# Altium integrated library RL2.IntLib: 663 symbols (part 4 of 4) (continued)
## PIC32MZ1024EFE100 (continued)

## PLD-6
designator XS?
Part Field 1: *; Part Field 2: *
footprint PLD-6
pins: 1, 2, 3, 4, 5, 6

## PLD-10R
designator XP?, comment PLD-R тип 2(8*13)
Value: *; Part Field 2: 10 конт.
footprint M20-9741042
pins: 1, 2, 3, 4, 5, 6, 7, 8, 9, 10
text: Цепь; Конт.

## PLD-12R
designator XP?, comment PLD-R тип 2(8*13)
Value: *; Part Field 2: 12 конт.
footprint M20-9740642
pins: 1, 2, 3, 4, 5, 6, 7, 8, 9, 10, 11, 12
text: Цепь; Конт.

## PLD-14
designator XP?
Value: *
footprint PLD-14
pins: 1, 2, 3, 4, 5, 6, 7, 8, 9, 10, 11, 12, 13, 14
text: Цепь; Конт.

## PMEG2010AEB
designator VD?  (value not drawn)
PMEG2010AEB; Value: *
footprint SOD523
pins: 1, 2

## PMEG2010AEH
designator VD?  (value not drawn)
PMEG2010AEH; Value: *
footprint SOD123F
pins: 1, 2

## PMEG10010ELR
designator VD?  (value not drawn)
100 V, 1 A low leakage current Schottky barrier rectifier; Value: *
footprint SOD123W
pins: 1, 2

## RCH110
designator L?
Part Field 1: *; Part Field 2: *
footprint RCH-110
pins: 1, 2

## RLB0914
designator L?
Part Field 1: *; Part Field 2: *
footprint RLB0914_H (radial induktor)
footprint RLB0914-V (radial induktor)
pins: 1, 2

## RSMD
designator R?
R0805; Part Field 1: *; Part Field 2: *; Value: *
footprint R0805
footprint R0603
footprint R1206
footprint R0805L
footprint R0603L
pins: 1 Pin1, 2 Pin2
1 alternate drawing of the same symbol

## RV-3129-C3
designator DD?, comment RV-3129-C3 32.768kHz OPTION A TB QA
Part Field 1: *; Part Field 2: *
footprint RV-3129-C3
pins: 1 CLKOE, 2 VDD, 3 CLKOUT, 4 SCL, 5 SDA, 6 VSS, 7 ~{INT}, 8 NC, 9 VBAT, 10 NC

## SCA3100
designator DA?, comment SCA3100-D04
3-AXIS HIGH PERFORMANCE ACCELEROMETER; Part Field 1: *; Part Field 2: *
footprint SCA3100
pins: 1 RES, 2 RES, 3 AVSS, 4 AVDD, 5 CSB, 6 MISO, 7 SCK, 8 MOSI, 9 NC, 10 DVDD, 11 DVSS, 12 EGND

## Si823H4
designator DA?, comment Si823H4AB-IS1
4.0 A Symmetric Drive ISODrivers with Low Propagation Delayand High Transient Immunity
footprint SOIC16
pins: 1 PWM (in), 3 VDDI (in), 4 GNDI (out), 5 EN (power), 6 DT (power), 8 VDDI (power), 9 GNDB (power), 10 VOB (power), 11 VDDB (power), 14 GNDA (power), 15 VOA (power), 16 VDDA (power)

## Si8233BB-C-IS1
designator DD?, comment Si8233BB-D-IS1
footprint SOIC16
pins: 1 VIA (in), 2 VIB (in), 3 VDDI (in), 4 GNDI (out), 5 DIS (power), 6 DT (power), 8 VDDI (power), 9 GNDB (power), 10 VOB (power), 11 VDDB (power), 14 GNDA (power), 15 VOA (power), 16 VDDA (power)

## Si8273
designator DA?, comment Si8273AB-IS1
4 Amp ISOdriver with High Transient (dV/dt) Immunity
footprint SOIC16
pins: 1 VIA (in), 2 VIB (in), 3 VDDI (in), 4 GNDI (out), 5 EN (power), 8 VDDI (power), 9 GNDB (power), 10 VOB (power), 11 VDDB (power), 14 GNDA (power), 15 VOA (power), 16 VDDA (power)

## SIP1X13P
designator XS?
Part Field 1: *; Part Field 2: *
footprint SIP1X13P
pins: 1, 2, 3, 4, 5, 6, 7, 8, 9, 10, 11, 12, 13

## SIP1X14P
designator XS?
Part Field 1: *; Part Field 2: *
footprint SIP1X14P
pins: 1, 2, 3, 4, 5, 6, 7, 8, 9, 10, 11, 12, 13, 14

## SN65LVDS93ADGG
designator DD?
footprint TSSOP56 (JEDEC MO-153)
signal-integrity model Model Name (Model Description)
pins: 1 VCC (power), 2 D5 (in), 3 D6 (in), 4 D7 (in), 5 GND (power), 6 D8 (in), 7 D9 (in), 8 D10 (in), 9 VCC (power), 10 D11 (in), 11 D12 (in), 12 D13 (in), 13 GND (power), 14 D14 (in), 15 D15 (in), 16 D16 (in), 17 CLKSEL (in), 18 D17 (in), 19 D18 (in), 20 D19 (in), 21 GND (power), 22 D20 (in), 23 D21 (in), 24 D22 (in), 25 D23 (in), 26 VCC (power), 27 D24 (in), 28 D25 (in), 29 GND (power), 30 D26 (in), 31 CLKIN (in), 32 ~{SHTDN} (in), 33 PLLGND (power), 34 PLLVCC (power), 35 PLLGND (power), 36 LVDSGND (power), 37 Y3P (hiz), 38 Y3M (hiz), 39 CLKOUTP (hiz), 40 CLKOUTM (hiz), 41 Y2P (hiz), 42 Y2M (hiz), 43 LVDSGND (power), 44 LVDSVCC (power), 45 Y1P (hiz), 46 Y1M (hiz), 47 Y0P (hiz), 48 Y0M (hiz), 49 LVDSGND (power), 50 D27 (in), 51 D0 (in), 52 D1 (in), 53 GND (power), 54 D2 (in), 55 D3 (in), 56 D4 (in)

## SN74LV4052AQPWRQ1
designator DD?
footprint TSSOP16 (JEDEC MO-153)
pins: 1 2Y0 (in), 2 2Y2 (in), 3 2COM (in), 4 2Y3 (out), 5 2Y1 (power), 6 INH (power), 7 GND (power), 8 GND (power), 9 A (power), 10 B (power), 11 1Y3 (power), 12 1Y0 (power), 13 1COM (power), 14 1Y1 (power), 15 1Y2 (power), 16 VCC (power)

## SQ9945BEY
designator VT?
footprint SOIC8 DBL FET
part A pins: 1, 2, 6
part B pins: 3, 4, 5

## SQJ963EP
designator VT?, comment SQJ963EP-T1-GE3
footprint PowerPAK SO-8L Dual
part A pins: 1, 2, 6
part B pins: 3, 4, 5

## SQJ992EP
designator VT?
footprint PowerPAK SO-8L Dual
part A pins: 1, 2, 6
part B pins: 3, 4, 5

## SRN3015
designator L?  (value not drawn)
Value: Value
footprint SRN3015 (Drossel)
pins: 1, 2

## SSW-110-01-G-S
designator XS?
Part Field 1: *; Part Field 2: *
footprint SSW-110-01-G-S
pins: 1, 2, 3, 4, 5, 6, 7, 8, 9, 10

## STGD5NB120SZT4
designator VT?  (value not drawn)
STGD5NB120SZT4; Value: *
footprint D-PAK (TO-252)
pins: 1 G, 2 E, 3 C

## STPS5H100B
designator VD?  (value not drawn)
High voltage power Schottky rectifier 100V 5A 175 °C; Value: *
footprint D-PAK (TO-252)
pins: 2, 3

## STTH1002CB
designator VD?
High efficiency ultrafast diode 2x8 A, 200V, 175 °C, 0.78V, 20ns; Value: *
footprint D-PAK (TO-252)
pins: 1 A1, 2 A2, 3 K

## THL3WI
designator DA?
footprint DC-DC-DIP-16
pins: 1 VI-, 2 EN, 9 VO+, 10 VO-, 16 VI+
text: DC\DC

## TL431AID
designator DA?
footprint SOIC8 JEDEC
pins: 1 C (in), 2 A (in), 3 A (in), 6 A (power), 7 A (power), 8 RF (power)

## TL3116ID
designator DA?
High-speed, Low-power Voltage Comparator
footprint SOIC8 JEDEC
pins: 1 V+ (power), 2 IN+ (in), 3 IN- (in), 4 V- (power), 5 LATCH (in), 6 GND (power), 7 OUT (out), 8 ~{OUT} (power)

## TLE4266G
designator DA?, comment TLE4266GS V10  (value not drawn)
TLE4266G; Value: *
footprint SOT-223
pins: 1 IN, 2 INH, 3 OUT, 4 GND

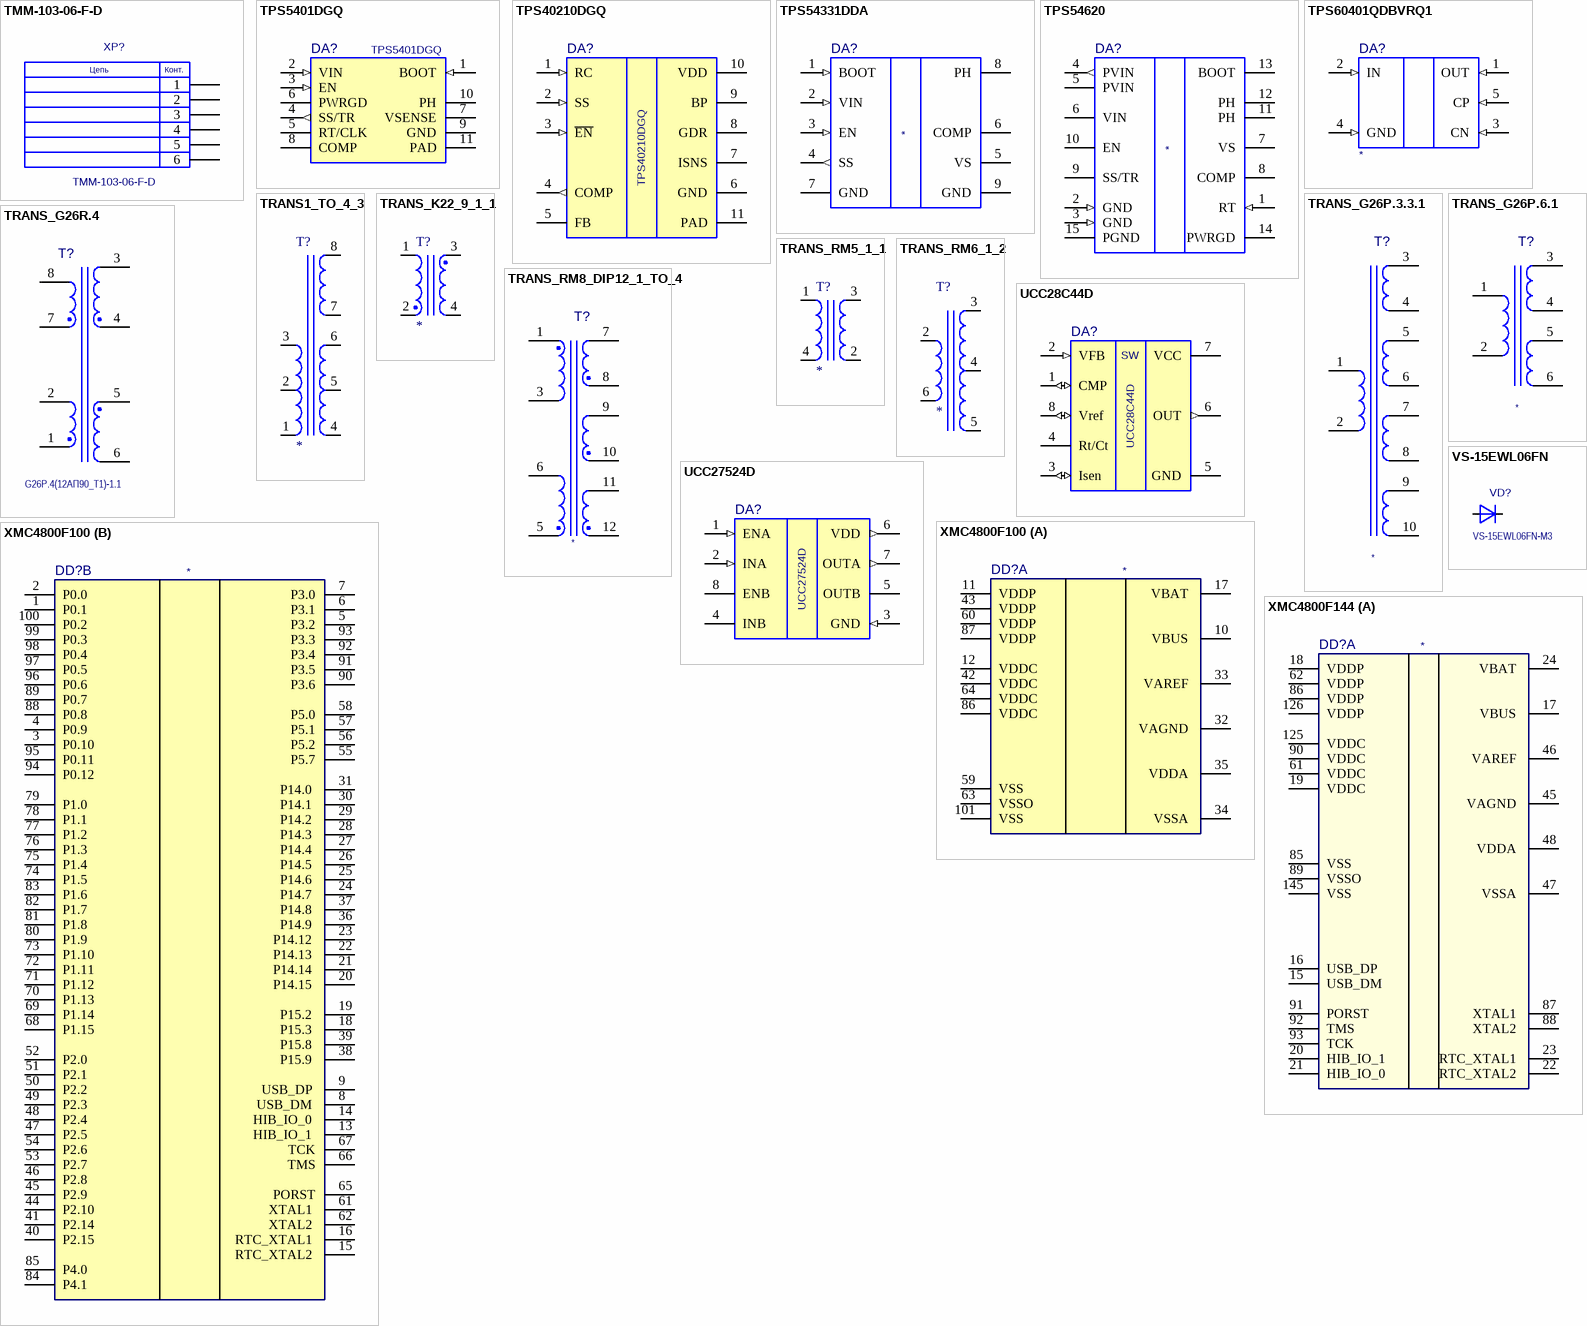
[diagram p32: symbols TMM-103-06-F-D to XMC4800F144]

## TMM-103-06-F-D
designator XP?
Value: *
footprint TMM-103-06-F-D
pins: 1, 2, 3, 4, 5, 6
text: Цепь; Конт.

## TPS5401DGQ
designator DA?
footprint MSOP10 POWERPAD (MO-187-BA)
pins: 1 BOOT (in), 2 VIN (in), 3 EN (in), 4 SS/TR (out), 5 RT/CLK (power), 6 PWRGD (power), 7 VSENSE (power), 8 COMP (power), 9 GND (power), 10 PH (power), 11 PAD (power)

## TPS40210DGQ
designator DA?
footprint MSOP10 POWERPAD (MO-187-BA)
pins: 1 RC (in), 2 SS (in), 3 ~{EN} (in), 4 COMP (out), 5 FB (power), 6 GND (power), 7 ISNS (power), 8 GDR (power), 9 BP (power), 10 VDD (power), 11 PAD (power)

## TPS54331DDA
designator DA?
footprint SOIC8 PowerPAD™
pins: 1 BOOT (in), 2 VIN (in), 3 EN (in), 4 SS (out), 5 VS (power), 6 COMP (power), 7 GND (power), 8 PH (power), 9 GND (power)

## TPS54620
designator DA?
footprint vqfn-14
pins: 1 RT (in), 2 GND (in), 3 GND (in), 4 PVIN (out), 5 PVIN (power), 6 VIN (power), 7 VS (power), 8 COMP (power), 9 SS/TR (power), 10 EN (power), 11 PH (power), 12 PH (power), 13 BOOT (power), 14 PWRGD (power), 15 PGND (power)

## TPS60401QDBVRQ1
designator DA?
footprint SOT23-5
pins: 1 OUT (in), 2 IN (in), 3 CN (in), 4 GND (in), 5 CP (in)

## TRANS1_TO_4_3
designator T?
Part Field 1: *; Part Field 2: *
footprint K24-8-8 (Дроссель)
pins: 1, 2, 3, 4, 5, 6, 7, 8

## TRANS_G26P.3.3.1
designator T?
Part Field 1: *; Part Field 2: *
footprint K22-7-2-8
pins: 1, 2, 3, 4, 5, 6, 7, 8, 9, 10

## TRANS_G26P.6.1
designator T?
Part Field 1: *; Part Field 2: *
footprint K22-7-2-4
pins: 1, 2, 3, 4, 5, 6

## TRANS_G26R.4
designator T?, comment G26P.4(12АП90_Т1)-1.1
Part Field 1: *; Part Field 2: *
footprint EFD20-1-8
footprint KB6-8-DIP
pins: 1, 2, 3, 4, 5, 6, 7, 8

## TRANS_K22_9_1_1
designator T?
Part Field 1: *; Part Field 2: *
footprint K22-9-2-2 (Дроссель)
pins: 1, 2, 3, 4

## TRANS_RM5_1_1
designator T?
Part Field 1: *; Part Field 2: *
footprint RM5-4
pins: 1, 2, 3, 4

## TRANS_RM6_1_2
designator T?
Part Field 1: *; Part Field 2: *
footprint RM6-6_E-045-1 (RM Cores B65807)
pins: 2, 3, 4, 5, 6

## TRANS_RM8_DIP12_1_TO_4
designator T?
Part Field 1: *; Part Field 2: *
footprint KB8-12-DIP FRM0224-K
pins: 1, 3, 5, 6, 7, 8, 9, 10, 11, 12

## UCC28C44D
designator DA?
footprint SOIC8 JEDEC
pins: 1 CMP (io), 2 VFB (in), 3 Isen (io), 4 Rt/Ct, 5 GND (power), 6 OUT (out), 7 VCC (power), 8 Vref (io)
text: SW

## UCC27524D
designator DA?
footprint SOIC8 JEDEC
pins: 1 ENA (in), 2 INA (in), 3 GND (in), 4 INB (power), 5 OUTB (power), 6 VDD (out), 7 OUTA (out), 8 ENB (power)

## VS-15EWL06FN
designator VD?, comment VS-15EWL06FN-M3
Ultralow VF Ultrafast Rectifier, 600V 15A 175 °C; Value: *
footprint D-PAK (TO-252) single diode
pins: 1, 3

## XMC4800F100
designator DD?
footprint LQFP100-25
part A pins: 10 VBUS  (power), 11 VDDP  (power), 12 VDDC  (power), 17 VBAT  (power), 32 VAGND  (power), 33 VAREF  (power), 34 VSSA  (power), 35 VDDA  (power), 42 VDDC  (power), 43 VDDP  (power), 59 VSS (power), 60 VDDP  (power), 63 VSSO  (power), 64 VDDC  (power), 86 VDDC  (power), 87 VDDP  (power), 101 VSS (power)
part B pins: 1 P0.1  (power), 2 P0.0  (power), 3 P0.10  (power), 4 P0.9  (power), 5 P3.2 (power), 6 P3.1 (power), 7 P3.0 (power), 8 USB_DM  (power), 9 USB_DP  (power), 13 HIB_IO_1  (power), 14 HIB_IO_0  (power), 15 RTC_XTAL2  (power), 16 RTC_XTAL1  (power), 18 P15.3  (power), 19 P15.2  (power), 20 P14.15  (power), 21 P14.14  (power), 22 P14.13  (power), 23 P14.12  (power), 24 P14.7  (power), 25 P14.6  (power), 26 P14.5  (power), 27 P14.4  (power), 28 P14.3  (power), 29 P14.2  (power), 30 P14.1  (power), 31 P14.0  (power), 36 P14.9  (power), 37 P14.8  (power), 38 P15.9  (power), 39 P15.8  (power), 40 P2.15  (power), 41 P2.14  (power), 44 P2.10  (power), 45 P2.9 (power), 46 P2.8 (power), 47 P2.5 (power), 48 P2.4 (power), 49 P2.3 (power), 50 P2.2 (power), 51 P2.1 (power), 52 P2.0 (power), 53 P2.7 (power), 54 P2.6 (power), 55 P5.7 (power), 56 P5.2 (power), 57 P5.1 (power), 58 P5.0 (power), 61 XTAL1  (power), 62 XTAL2  (power), 65 PORST (power), 66 TMS (power), 67 TCK (power), 68 P1.15  (power), 69 P1.14  (power), 70 P1.13  (power), 71 P1.12  (power), 72 P1.11  (power), 73 P1.10  (power), 74 P1.5 (power), 75 P1.4 (power), 76 P1.3 (power), 77 P1.2 (power), 78 P1.1 (power), 79 P1.0 (power), 80 P1.9 (power), 81 P1.8 (power), 82 P1.7 (power), 83 P1.6 (power), 84 P4.1 (power), 85 P4.0 (power), 88 P0.8  (power), 89 P0.7  (power), 90 P3.6 (power), 91 P3.5 (power), 92 P3.4 (power), 93 P3.3 (power), 94 P0.12  (power), 95 P0.11  (power), 96 P0.6  (power), 97 P0.5  (power), 98 P0.4  (power), 99 P0.3  (power), 100 P0.2  (power)

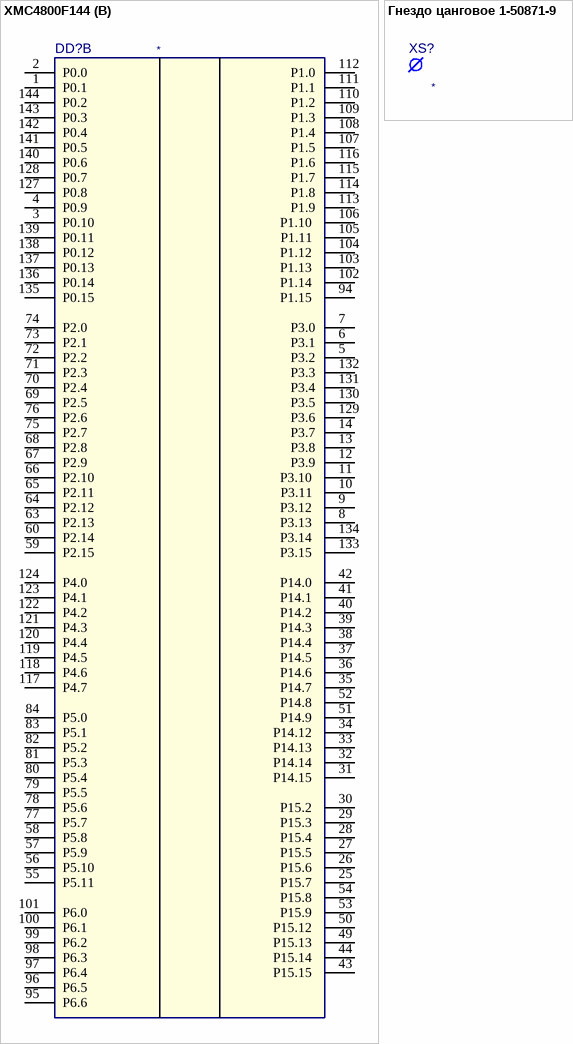
[diagram p33: symbols XMC4800F144 to Гнездо цанговое 1-50871-9]

## XMC4800F144
designator DD?
footprint LQFP144-24
part A pins: 15 USB_DM  (power), 16 USB_DP  (power), 17 VBUS  (power), 18 VDDP  (power), 19 VDDC  (power), 20 HIB_IO_1  (power), 21 HIB_IO_0  (power), 22 RTC_XTAL2  (power), 23 RTC_XTAL1  (power), 24 VBAT  (power), 45 VAGND  (power), 46 VAREF  (power), 47 VSSA  (power), 48 VDDA  (power), 61 VDDC  (power), 62 VDDP  (power), 85 VSS (power), 86 VDDP  (power), 87 XTAL1  (power), 88 XTAL2  (power), 89 VSSO  (power), 90 VDDC  (power), 91 PORST (power), 92 TMS (power), 93 TCK (power), 125 VDDC  (power), 126 VDDP  (power), 145 VSS (power)
part B pins: 1 P0.1  (power), 2 P0.0  (power), 3 P0.10  (power), 4 P0.9  (power), 5 P3.2 (power), 6 P3.1 (power), 7 P3.0 (power), 8 P3.13  (power), 9 P3.12  (power), 10 P3.11  (power), 11 P3.10  (power), 12 P3.9 (power), 13 P3.8 (power), 14 P3.7 (power), 25 P15.7  (power), 26 P15.6  (power), 27 P15.5  (power), 28 P15.4  (power), 29 P15.3  (power), 30 P15.2  (power), 31 P14.15  (power), 32 P14.14  (power), 33 P14.13  (power), 34 P14.12  (power), 35 P14.7  (power), 36 P14.6  (power), 37 P14.5  (power), 38 P14.4  (power), 39 P14.3  (power), 40 P14.2  (power), 41 P14.1  (power), 42 P14.0  (power), 43 P15.15  (power), 44 P15.14  (power), 49 P15.13  (power), 50 P15.12  (power), 51 P14.9  (power), 52 P14.8  (power), 53 P15.9  (power), 54 P15.8  (power), 55 P5.11  (power), 56 P5.10  (power), 57 P5.9 (power), 58 P5.8 (power), 59 P2.15  (power), 60 P2.14  (power), 63 P2.13  (power), 64 P2.12  (power), 65 P2.11  (power), 66 P2.10  (power), 67 P2.9 (power), 68 P2.8 (power), 69 P2.5 (power), 70 P2.4 (power), 71 P2.3 (power), 72 P2.2 (power), 73 P2.1 (power), 74 P2.0 (power), 75 P2.7 (power), 76 P2.6 (power), 77 P5.7 (power), 78 P5.6 (power), 79 P5.5 (power), 80 P5.4 (power), 81 P5.3 (power), 82 P5.2 (power), 83 P5.1 (power), 84 P5.0 (power), 94 P1.15  (power), 95 P6.6 (power), 96 P6.5 (power), 97 P6.4 (power), 98 P6.3 (power), 99 P6.2 (power), 100 P6.1 (power), 101 P6.0 (power), 102 P1.14  (power), 103 P1.13  (power), 104 P1.12  (power), 105 P1.11  (power), 106 P1.10  (power), 107 P1.5 (power), 108 P1.4 (power), 109 P1.3 (power), 110 P1.2 (power), 111 P1.1 (power), 112 P1.0 (power), 113 P1.9 (power), 114 P1.8 (power), 115 P1.7 (power), 116 P1.6 (power), 117 P4.7 (power), 118 P4.6 (power), 119 P4.5 (power), 120 P4.4 (power), 121 P4.3 (power), 122 P4.2 (power), 123 P4.1 (power), 124 P4.0 (power), 127 P0.8  (power), 128 P0.7  (power), 129 P3.6 (power), 130 P3.5 (power), 131 P3.4 (power), 132 P3.3 (power), 133 P3.15  (power), 134 P3.14  (power), 135 P0.15  (power), 136 P0.14  (power), 137 P0.13  (power), 138 P0.12  (power), 139 P0.11  (power), 140 P0.6  (power), 141 P0.5  (power), 142 P0.4  (power), 143 P0.3  (power), 144 P0.2  (power)

## Гнездо цанговое 1-50871-9
designator XS?
footprint Гнездо цанговое 1-50871-9
pins: 0 1A


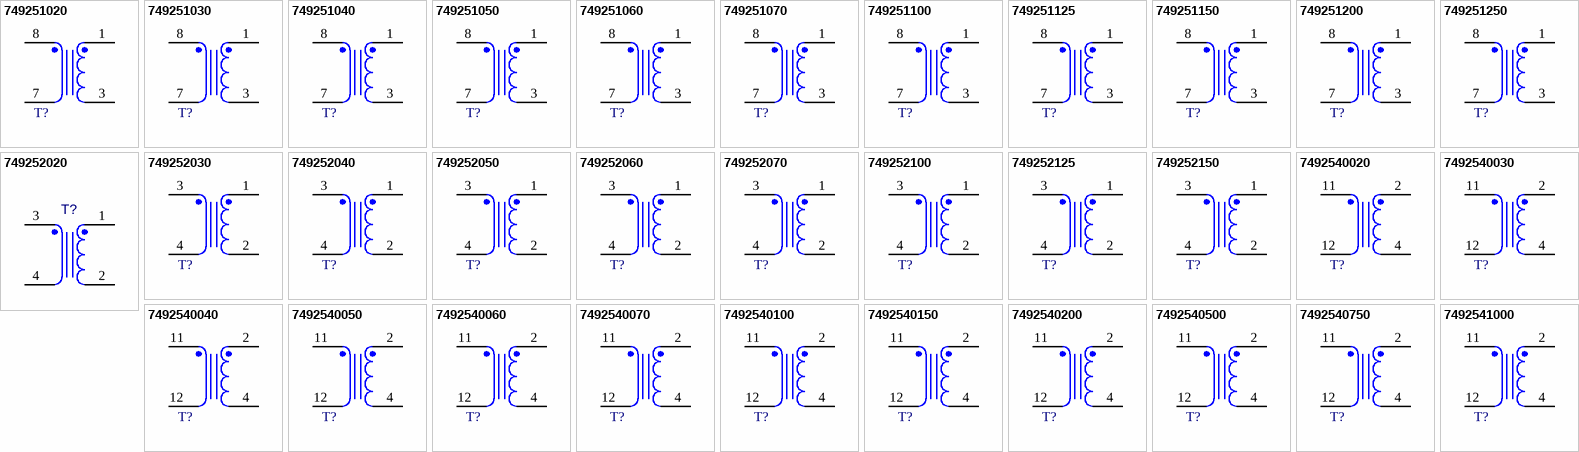
[diagram p34: symbols 749251020 to 7492541000]

## 749251020
designator T?, comment 80uH, 1:20, 80V  (value not drawn)
WE-CST Current Sense Transformer, SMT, EE5, 80uH, 1:20, 80V; Manufacturer Part Number: 749251020; Manufacturer: Wurth Elektronik; DC Resistance 1: 0.75mOhm; DC Resistance 2: 0.2Ohm; Insulation Test Voltage: 500VAC; Rated Current: 20A; Voltage-µSecond: 10uVs; Category: Current Sense Transformers; Match Code: WE-CST; ComponentLink1Description: Website Link; ComponentLink1URL: https://www.we-online.com/redexpert/article/749251020?ad; ComponentLink2Description: Datasheet Link; ComponentLink2URL: https://www.we-online.com/redexpert/spec/749251020?ad; Mount: Surface Mount; Operating Temperature Max: 125°C; Operating Temperature Min: -40°C; Packaging: Tape and Reel; Case/Size Code: EE5; Length: 7.7mm; Width: 6.9mm; Height: 5.33mm; Inductance: 80uH; Rated Voltage: 80V; Turns Ratio: 1:20
footprint WE-CST_EE5
simulation model 749251020
pins: 1, 3, 7, 8

## 749251030
designator T?, comment 180uH, 1:30, 80V  (value not drawn)
WE-CST Current Sense Transformer, SMT, EE5, 180uH, 1:30, 80V; Manufacturer Part Number: 749251030; Manufacturer: Wurth Elektronik; DC Resistance 1: 0.75mOhm; DC Resistance 2: 0.48Ohm; Insulation Test Voltage: 500VAC; Rated Current: 20A; Voltage-µSecond: 15uVs; Category: Current Sense Transformers; Match Code: WE-CST; ComponentLink1Description: Website Link; ComponentLink1URL: https://www.we-online.com/redexpert/article/749251030?ad; ComponentLink2Description: Datasheet Link; ComponentLink2URL: https://www.we-online.com/redexpert/spec/749251030?ad; Mount: Surface Mount; Operating Temperature Max: 125°C; Operating Temperature Min: -40°C; Packaging: Tape and Reel; Case/Size Code: EE5; Length: 7.7mm; Width: 6.9mm; Height: 5.33mm; Inductance: 180uH; Rated Voltage: 80V; Turns Ratio: 1:30
footprint WE-CST_EE5
simulation model 749251030
pins: 1, 3, 7, 8

## 749251040
designator T?, comment 320uH, 1:40, 80V  (value not drawn)
WE-CST Current Sense Transformer, SMT, EE5, 320uH, 1:40, 80V; Manufacturer Part Number: 749251040; Manufacturer: Wurth Elektronik; DC Resistance 1: 0.75mOhm; DC Resistance 2: 0.9Ohm; Insulation Test Voltage: 500VAC; Rated Current: 20A; Voltage-µSecond: 20uVs; Category: Current Sense Transformers; Match Code: WE-CST; ComponentLink1Description: Website Link; ComponentLink1URL: https://www.we-online.com/redexpert/article/749251040?ad; ComponentLink2Description: Datasheet Link; ComponentLink2URL: https://www.we-online.com/redexpert/spec/749251040?ad; Mount: Surface Mount; Operating Temperature Max: 125°C; Operating Temperature Min: -40°C; Packaging: Tape and Reel; Case/Size Code: EE5; Length: 7.7mm; Width: 6.9mm; Height: 5.33mm; Inductance: 320uH; Rated Voltage: 80V; Turns Ratio: 1:40
footprint WE-CST_EE5
simulation model 749251040
pins: 1, 3, 7, 8

## 749251050
designator T?, comment 500uH, 1:50, 80V  (value not drawn)
WE-CST Current Sense Transformer, SMT, EE5, 500uH, 1:50, 80V; Manufacturer Part Number: 749251050; Manufacturer: Wurth Elektronik; DC Resistance 1: 0.75mOhm; DC Resistance 2: 1.4Ohm; Insulation Test Voltage: 500VAC; Rated Current: 20A; Voltage-µSecond: 25uVs; Category: Current Sense Transformers; Match Code: WE-CST; ComponentLink1Description: Website Link; ComponentLink1URL: https://www.we-online.com/redexpert/article/749251050?ad; ComponentLink2Description: Datasheet Link; ComponentLink2URL: https://www.we-online.com/redexpert/spec/749251050?ad; Mount: Surface Mount; Operating Temperature Max: 125°C; Operating Temperature Min: -40°C; Packaging: Tape and Reel; Case/Size Code: EE5; Length: 7.7mm; Width: 6.9mm; Height: 5.33mm; Inductance: 500uH; Rated Voltage: 80V; Turns Ratio: 1:50
footprint WE-CST_EE5
simulation model 749251050
pins: 1, 3, 7, 8

## 749251060
designator T?, comment 720uH, 1:60, 80V  (value not drawn)
WE-CST Current Sense Transformer, SMT, EE5, 720uH, 1:60, 80V; Manufacturer Part Number: 749251060; Manufacturer: Wurth Elektronik; DC Resistance 1: 0.75mOhm; DC Resistance 2: 1.75Ohm; Insulation Test Voltage: 500VAC; Rated Current: 20A; Voltage-µSecond: 30uVs; Category: Current Sense Transformers; Match Code: WE-CST; ComponentLink1Description: Website Link; ComponentLink1URL: https://www.we-online.com/redexpert/article/749251060?ad; ComponentLink2Description: Datasheet Link; ComponentLink2URL: https://www.we-online.com/redexpert/spec/749251060?ad; Mount: Surface Mount; Operating Temperature Max: 125°C; Operating Temperature Min: -40°C; Packaging: Tape and Reel; Case/Size Code: EE5; Length: 7.7mm; Width: 6.9mm; Height: 5.33mm; Inductance: 720uH; Rated Voltage: 80V; Turns Ratio: 1:60
footprint WE-CST_EE5
simulation model 749251060
pins: 1, 3, 7, 8

## 749251070
designator T?, comment 980uH, 1:70, 80V  (value not drawn)
WE-CST Current Sense Transformer, SMT, EE5, 980uH, 1:70, 80V; Manufacturer Part Number: 749251070; Manufacturer: Wurth Elektronik; DC Resistance 1: 0.75mOhm; DC Resistance 2: 2.2Ohm; Insulation Test Voltage: 500VAC; Rated Current: 20A; Voltage-µSecond: 35uVs; Category: Current Sense Transformers; Match Code: WE-CST; ComponentLink1Description: Website Link; ComponentLink1URL: https://www.we-online.com/redexpert/article/749251070?ad; ComponentLink2Description: Datasheet Link; ComponentLink2URL: https://www.we-online.com/redexpert/spec/749251070?ad; Mount: Surface Mount; Operating Temperature Max: 125°C; Operating Temperature Min: -40°C; Packaging: Tape and Reel; Case/Size Code: EE5; Length: 7.7mm; Width: 6.9mm; Height: 5.33mm; Inductance: 980uH; Rated Voltage: 80V; Turns Ratio: 1:70
footprint WE-CST_EE5
simulation model 749251070
pins: 1, 3, 7, 8

## 749251100
designator T?, comment 2000uH, 1:100, 80V  (value not drawn)
WE-CST Current Sense Transformer, SMT, EE5, 2000uH, 1:100, 80V; Manufacturer Part Number: 749251100; Manufacturer: Wurth Elektronik; DC Resistance 1: 0.75mOhm; DC Resistance 2: 5.5Ohm; Insulation Test Voltage: 500VAC; Rated Current: 20A; Voltage-µSecond: 50uVs; Category: Current Sense Transformers; Match Code: WE-CST; ComponentLink1Description: Website Link; ComponentLink1URL: https://www.we-online.com/redexpert/article/749251100?ad; ComponentLink2Description: Datasheet Link; ComponentLink2URL: https://www.we-online.com/redexpert/spec/749251100?ad; Mount: Surface Mount; Operating Temperature Max: 125°C; Operating Temperature Min: -40°C; Packaging: Tape and Reel; Case/Size Code: EE5; Length: 7.7mm; Width: 6.9mm; Height: 5.33mm; Inductance: 2000uH; Rated Voltage: 80V; Turns Ratio: 1:100
footprint WE-CST_EE5
simulation model 749251100
pins: 1, 3, 7, 8

## 749251125
designator T?, comment 3000uH, 1:125, 80V  (value not drawn)
WE-CST Current Sense Transformer, SMT, EE5, 3000uH, 1:125, 80V; Manufacturer Part Number: 749251125; Manufacturer: Wurth Elektronik; DC Resistance 1: 0.75mOhm; DC Resistance 2: 6.5Ohm; Insulation Test Voltage: 500VAC; Rated Current: 20A; Voltage-µSecond: 68uVs; Category: Current Sense Transformers; Match Code: WE-CST; ComponentLink1Description: Website Link; ComponentLink1URL: https://www.we-online.com/redexpert/article/749251125?ad; ComponentLink2Description: Datasheet Link; ComponentLink2URL: https://www.we-online.com/redexpert/spec/749251125?ad; Mount: Surface Mount; Operating Temperature Max: 125°C; Operating Temperature Min: -40°C; Packaging: Tape and Reel; Case/Size Code: EE5; Length: 7.7mm; Width: 6.9mm; Height: 5.33mm; Inductance: 3000uH; Rated Voltage: 80V; Turns Ratio: 1:125
footprint WE-CST_EE5
simulation model 749251125
pins: 1, 3, 7, 8

## 749251150
designator T?, comment 4500uH, 1:150, 80V  (value not drawn)
WE-CST Current Sense Transformer, SMT, EE5, 4500uH, 1:150, 80V; Manufacturer Part Number: 749251150; Manufacturer: Wurth Elektronik; DC Resistance 1: 0.75mOhm; DC Resistance 2: 9.5Ohm; Insulation Test Voltage: 500VAC; Rated Current: 20A; Voltage-µSecond: 75uVs; Category: Current Sense Transformers; Match Code: WE-CST; ComponentLink1Description: Website Link; ComponentLink1URL: https://www.we-online.com/redexpert/article/749251150?ad; ComponentLink2Description: Datasheet Link; ComponentLink2URL: https://www.we-online.com/redexpert/spec/749251150?ad; Mount: Surface Mount; Operating Temperature Max: 125°C; Operating Temperature Min: -40°C; Packaging: Tape and Reel; Case/Size Code: EE5; Length: 7.7mm; Width: 6.9mm; Height: 5.33mm; Inductance: 4500uH; Rated Voltage: 80V; Turns Ratio: 1:150
footprint WE-CST_EE5
simulation model 749251150
pins: 1, 3, 7, 8

## 749251200
designator T?, comment 8000uH, 1:200, 80V  (value not drawn)
WE-CST Current Sense Transformer, SMT, EE5, 8000uH, 1:200, 80V; Manufacturer Part Number: 749251200; Manufacturer: Wurth Elektronik; DC Resistance 1: 0.75mOhm; DC Resistance 2: 16.5Ohm; Insulation Test Voltage: 500VAC; Rated Current: 20A; Voltage-µSecond: 100uVs; Category: Current Sense Transformers; Match Code: WE-CST; ComponentLink1Description: Website Link; ComponentLink1URL: https://www.we-online.com/redexpert/article/749251200?ad; ComponentLink2Description: Datasheet Link; ComponentLink2URL: https://www.we-online.com/redexpert/spec/749251200?ad; Mount: Surface Mount; Operating Temperature Max: 125°C; Operating Temperature Min: -40°C; Packaging: Tape and Reel; Case/Size Code: EE5; Length: 7.7mm; Width: 6.9mm; Height: 5.33mm; Inductance: 8000uH; Rated Voltage: 80V; Turns Ratio: 1:200
footprint WE-CST_EE5
simulation model 749251200
pins: 1, 3, 7, 8

## 749251250
designator T?, comment 12500uH, 1:250, 80V  (value not drawn)
WE-CST Current Sense Transformer, SMT, EE5, 12500uH, 1:250, 80V; Manufacturer Part Number: 749251250; Manufacturer: Wurth Elektronik; DC Resistance 1: 0.75mOhm; DC Resistance 2: 23.5Ohm; Insulation Test Voltage: 500VAC; Rated Current: 20A; Voltage-µSecond: 125uVs; Category: Current Sense Transformers; Match Code: WE-CST; ComponentLink1Description: Website Link; ComponentLink1URL: https://www.we-online.com/redexpert/article/749251250?ad; ComponentLink2Description: Datasheet Link; ComponentLink2URL: https://www.we-online.com/redexpert/spec/749251250?ad; Mount: Surface Mount; Operating Temperature Max: 125°C; Operating Temperature Min: -40°C; Packaging: Tape and Reel; Case/Size Code: EE5; Length: 7.7mm; Width: 6.9mm; Height: 5.33mm; Inductance: 12500uH; Rated Voltage: 80V; Turns Ratio: 1:250
footprint WE-CST_EE5
simulation model 749251250
pins: 1, 3, 7, 8

## 749252020
designator T?, comment 33uH, 1:20, 80V  (value not drawn)
WE-CST Current Sense Transformer, SMT, EE4.4, 33uH, 1:20, 80V; Manufacturer Part Number: 749252020; Manufacturer: Wurth Elektronik; DC Resistance 1: 3mOhm; DC Resistance 2: 0.35Ohm; Insulation Test Voltage: 750VAC; Rated Current: 7A; Voltage-µSecond: 9uVs; Category: Current Sense Transformers; Match Code: WE-CST; ComponentLink1Description: Website Link; ComponentLink1URL: https://www.we-online.com/redexpert/article/749252020?ad; ComponentLink2Description: Datasheet Link; ComponentLink2URL: https://www.we-online.com/redexpert/spec/749252020?ad; Mount: Surface Mount; Operating Temperature Max: 125°C; Operating Temperature Min: -40°C; Packaging: Tape and Reel; Case/Size Code: EE4.4; Length: 4.7mm; Width: 4.65mm; Height: 3.55mm; Inductance: 33uH; Rated Voltage: 80V; Turns Ratio: 1:20
footprint WE-CST_EE4.4
simulation model 749252020
pins: 1, 2, 3, 4

## 749252030
designator T?, comment 74uH, 1:30, 80V  (value not drawn)
WE-CST Current Sense Transformer, SMT, EE4.4, 74uH, 1:30, 80V; Manufacturer Part Number: 749252030; Manufacturer: Wurth Elektronik; DC Resistance 1: 3mOhm; DC Resistance 2: 0.8Ohm; Insulation Test Voltage: 750VAC; Rated Current: 7A; Voltage-µSecond: 13.5uVs; Category: Current Sense Transformers; Match Code: WE-CST; ComponentLink1Description: Website Link; ComponentLink1URL: https://www.we-online.com/redexpert/article/749252030?ad; ComponentLink2Description: Datasheet Link; ComponentLink2URL: https://www.we-online.com/redexpert/spec/749252030?ad; Mount: Surface Mount; Operating Temperature Max: 125°C; Operating Temperature Min: -40°C; Packaging: Tape and Reel; Case/Size Code: EE4.4; Length: 4.7mm; Width: 4.65mm; Height: 3.55mm; Inductance: 74uH; Rated Voltage: 80V; Turns Ratio: 1:30
footprint WE-CST_EE4.4
simulation model 749252030
pins: 1, 2, 3, 4

## 749252040
designator T?, comment 132uH, 1:40, 80V  (value not drawn)
WE-CST Current Sense Transformer, SMT, EE4.4, 132uH, 1:40, 80V; Manufacturer Part Number: 749252040; Manufacturer: Wurth Elektronik; DC Resistance 1: 3mOhm; DC Resistance 2: 1.6Ohm; Insulation Test Voltage: 750VAC; Rated Current: 7A; Voltage-µSecond: 18uVs; Category: Current Sense Transformers; Match Code: WE-CST; ComponentLink1Description: Website Link; ComponentLink1URL: https://www.we-online.com/redexpert/article/749252040?ad; ComponentLink2Description: Datasheet Link; ComponentLink2URL: https://www.we-online.com/redexpert/spec/749252040?ad; Mount: Surface Mount; Operating Temperature Max: 125°C; Operating Temperature Min: -40°C; Packaging: Tape and Reel; Case/Size Code: EE4.4; Length: 4.7mm; Width: 4.65mm; Height: 3.55mm; Inductance: 132uH; Rated Voltage: 80V; Turns Ratio: 1:40
footprint WE-CST_EE4.4
simulation model 749252040
pins: 1, 2, 3, 4

## 749252050
designator T?, comment 205uH, 1:50, 80V  (value not drawn)
WE-CST Current Sense Transformer, SMT, EE4.4, 205uH, 1:50, 80V; Manufacturer Part Number: 749252050; Manufacturer: Wurth Elektronik; DC Resistance 1: 3mOhm; DC Resistance 2: 2.5Ohm; Insulation Test Voltage: 750VAC; Rated Current: 7A; Voltage-µSecond: 22.5uVs; Category: Current Sense Transformers; Match Code: WE-CST; ComponentLink1Description: Website Link; ComponentLink1URL: https://www.we-online.com/redexpert/article/749252050?ad; ComponentLink2Description: Datasheet Link; ComponentLink2URL: https://www.we-online.com/redexpert/spec/749252050?ad; Mount: Surface Mount; Operating Temperature Max: 125°C; Operating Temperature Min: -40°C; Packaging: Tape and Reel; Case/Size Code: EE4.4; Length: 4.7mm; Width: 4.65mm; Height: 3.55mm; Inductance: 205uH; Rated Voltage: 80V; Turns Ratio: 1:50
footprint WE-CST_EE4.4
simulation model 749252050
pins: 1, 2, 3, 4

## 749252060
designator T?, comment 295uH, 1:60, 80V  (value not drawn)
WE-CST Current Sense Transformer, SMT, EE4.4, 295uH, 1:60, 80V; Manufacturer Part Number: 749252060; Manufacturer: Wurth Elektronik; DC Resistance 1: 3mOhm; DC Resistance 2: 3.6Ohm; Insulation Test Voltage: 750VAC; Rated Current: 7A; Voltage-µSecond: 27uVs; Category: Current Sense Transformers; Match Code: WE-CST; ComponentLink1Description: Website Link; ComponentLink1URL: https://www.we-online.com/redexpert/article/749252060?ad; ComponentLink2Description: Datasheet Link; ComponentLink2URL: https://www.we-online.com/redexpert/spec/749252060?ad; Mount: Surface Mount; Operating Temperature Max: 125°C; Operating Temperature Min: -40°C; Packaging: Tape and Reel; Case/Size Code: EE4.4; Length: 4.7mm; Width: 4.65mm; Height: 3.55mm; Inductance: 295uH; Rated Voltage: 80V; Turns Ratio: 1:60
footprint WE-CST_EE4.4
simulation model 749252060
pins: 1, 2, 3, 4

## 749252070
designator T?, comment 400uH, 1:70, 80V  (value not drawn)
WE-CST Current Sense Transformer, SMT, EE4.4, 400uH, 1:70, 80V; Manufacturer Part Number: 749252070; Manufacturer: Wurth Elektronik; DC Resistance 1: 3mOhm; DC Resistance 2: 4.6Ohm; Insulation Test Voltage: 750VAC; Rated Current: 7A; Voltage-µSecond: 31.5uVs; Category: Current Sense Transformers; Match Code: WE-CST; ComponentLink1Description: Website Link; ComponentLink1URL: https://www.we-online.com/redexpert/article/749252070?ad; ComponentLink2Description: Datasheet Link; ComponentLink2URL: https://www.we-online.com/redexpert/spec/749252070?ad; Mount: Surface Mount; Operating Temperature Max: 125°C; Operating Temperature Min: -40°C; Packaging: Tape and Reel; Case/Size Code: EE4.4; Length: 4.7mm; Width: 4.65mm; Height: 3.55mm; Inductance: 400uH; Rated Voltage: 80V; Turns Ratio: 1:70
footprint WE-CST_EE4.4
simulation model 749252070
pins: 1, 2, 3, 4

## 749252100
designator T?, comment 820uH, 1:100, 80V  (value not drawn)
WE-CST Current Sense Transformer, SMT, EE4.4, 820uH, 1:100, 80V; Manufacturer Part Number: 749252100; Manufacturer: Wurth Elektronik; DC Resistance 1: 3mOhm; DC Resistance 2: 9.5Ohm; Insulation Test Voltage: 750VAC; Rated Current: 7A; Voltage-µSecond: 45uVs; Category: Current Sense Transformers; Match Code: WE-CST; ComponentLink1Description: Website Link; ComponentLink1URL: https://www.we-online.com/redexpert/article/749252100?ad; ComponentLink2Description: Datasheet Link; ComponentLink2URL: https://www.we-online.com/redexpert/spec/749252100?ad; Mount: Surface Mount; Operating Temperature Max: 125°C; Operating Temperature Min: -40°C; Packaging: Tape and Reel; Case/Size Code: EE4.4; Length: 4.7mm; Width: 4.65mm; Height: 3.55mm; Inductance: 820uH; Rated Voltage: 80V; Turns Ratio: 1:100
footprint WE-CST_EE4.4
simulation model 749252100
pins: 1, 2, 3, 4

## 749252125
designator T?, comment 1280uH, 1:125, 80V  (value not drawn)
WE-CST Current Sense Transformer, SMT, EE4.4, 1280uH, 1:125, 80V; Manufacturer Part Number: 749252125; Manufacturer: Wurth Elektronik; DC Resistance 1: 3mOhm; DC Resistance 2: 13Ohm; Insulation Test Voltage: 750VAC; Rated Current: 7A; Voltage-µSecond: 56.2uVs; Category: Current Sense Transformers; Match Code: WE-CST; ComponentLink1Description: Website Link; ComponentLink1URL: https://www.we-online.com/redexpert/article/749252125?ad; ComponentLink2Description: Datasheet Link; ComponentLink2URL: https://www.we-online.com/redexpert/spec/749252125?ad; Mount: Surface Mount; Operating Temperature Max: 125°C; Operating Temperature Min: -40°C; Packaging: Tape and Reel; Case/Size Code: EE4.4; Length: 4.7mm; Width: 4.65mm; Height: 3.55mm; Inductance: 1280uH; Rated Voltage: 80V; Turns Ratio: 1:125
footprint WE-CST_EE4.4
simulation model 749252125
pins: 1, 2, 3, 4

## 749252150
designator T?, comment 1800uH, 1:150, 80V  (value not drawn)
WE-CST Current Sense Transformer, SMT, EE4.4, 1800uH, 1:150, 80V; Manufacturer Part Number: 749252150; Manufacturer: Wurth Elektronik; DC Resistance 1: 3mOhm; DC Resistance 2: 21Ohm; Insulation Test Voltage: 750VAC; Rated Current: 7A; Voltage-µSecond: 67.5uVs; Category: Current Sense Transformers; Match Code: WE-CST; ComponentLink1Description: Website Link; ComponentLink1URL: https://www.we-online.com/redexpert/article/749252150?ad; ComponentLink2Description: Datasheet Link; ComponentLink2URL: https://www.we-online.com/redexpert/spec/749252150?ad; Mount: Surface Mount; Operating Temperature Max: 125°C; Operating Temperature Min: -40°C; Packaging: Tape and Reel; Case/Size Code: EE4.4; Length: 4.7mm; Width: 4.65mm; Height: 3.55mm; Inductance: 1800uH; Rated Voltage: 80V; Turns Ratio: 1:150
footprint WE-CST_EE4.4
simulation model 749252150
pins: 1, 2, 3, 4

## 7492540020
designator T?, comment 224uH, 1:20, 80V  (value not drawn)
WE-CST Current Sense Transformer, SMT, EE13/7/4, 224uH, 1:20, 80V; Manufacturer Part Number: 7492540020; Manufacturer: Wurth Elektronik; DC Resistance 1: 0.28mOhm; DC Resistance 2: 0.033Ohm; Insulation Test Voltage: 1500VAC; Rated Current: 40A; Voltage-µSecond: 49uVs; Category: Current Sense Transformers; Match Code: WE-CST; ComponentLink1Description: Website Link; ComponentLink1URL: https://www.we-online.com/redexpert/article/7492540020?ad; ComponentLink2Description: Datasheet Link; ComponentLink2URL: https://www.we-online.com/redexpert/spec/7492540020?ad; Mount: Surface Mount; Operating Temperature Max: 130°C; Operating Temperature Min: -40°C; Packaging: Tape and Reel; Case/Size Code: EE13/7/4; Length: 20.2mm; Width: 14.48mm; Height: 10.5mm; Inductance: 224uH; Rated Voltage: 80V; Turns Ratio: 1:20
footprint WE-CST_EE13/7/4
simulation model 7492540020
pins: 2, 4, 11, 12

## 7492540030
designator T?, comment 504uH, 1:30, 80V  (value not drawn)
WE-CST Current Sense Transformer, SMT, EE13/7/4, 504uH, 1:30, 80V; Manufacturer Part Number: 7492540030; Manufacturer: Wurth Elektronik; DC Resistance 1: 0.28mOhm; DC Resistance 2: 0.093Ohm; Insulation Test Voltage: 1500VAC; Rated Current: 40A; Voltage-µSecond: 74uVs; Category: Current Sense Transformers; Match Code: WE-CST; ComponentLink1Description: Website Link; ComponentLink1URL: https://www.we-online.com/redexpert/article/7492540030?ad; ComponentLink2Description: Datasheet Link; ComponentLink2URL: https://www.we-online.com/redexpert/spec/7492540030?ad; Mount: Surface Mount; Operating Temperature Max: 130°C; Operating Temperature Min: -40°C; Packaging: Tape and Reel; Case/Size Code: EE13/7/4; Length: 20.2mm; Width: 14.48mm; Height: 10.5mm; Inductance: 504uH; Rated Voltage: 80V; Turns Ratio: 1:30
footprint WE-CST_EE13/7/4
simulation model 7492540030
pins: 2, 4, 11, 12

## 7492540040
designator T?, comment 896uH, 1:40, 80V  (value not drawn)
WE-CST Current Sense Transformer, SMT, EE13/7/4, 896uH, 1:40, 80V; Manufacturer Part Number: 7492540040; Manufacturer: Wurth Elektronik; DC Resistance 1: 0.28mOhm; DC Resistance 2: 0.13Ohm; Insulation Test Voltage: 1500VAC; Rated Current: 40A; Voltage-µSecond: 99uVs; Category: Current Sense Transformers; Match Code: WE-CST; ComponentLink1Description: Website Link; ComponentLink1URL: https://www.we-online.com/redexpert/article/7492540040?ad; ComponentLink2Description: Datasheet Link; ComponentLink2URL: https://www.we-online.com/redexpert/spec/7492540040?ad; Mount: Surface Mount; Operating Temperature Max: 130°C; Operating Temperature Min: -40°C; Packaging: Tape and Reel; Case/Size Code: EE13/7/4; Length: 20.2mm; Width: 14.48mm; Height: 10.5mm; Inductance: 896uH; Rated Voltage: 80V; Turns Ratio: 1:40
footprint WE-CST_EE13/7/4
simulation model 7492540040
pins: 2, 4, 11, 12

## 7492540050
designator T?, comment 1400uH, 1:50, 80V  (value not drawn)
WE-CST Current Sense Transformer, SMT, EE13/7/4, 1400uH, 1:50, 80V; Manufacturer Part Number: 7492540050; Manufacturer: Wurth Elektronik; DC Resistance 1: 0.28mOhm; DC Resistance 2: 0.202Ohm; Insulation Test Voltage: 1500VAC; Rated Current: 40A; Voltage-µSecond: 124uVs; Category: Current Sense Transformers; Match Code: WE-CST; ComponentLink1Description: Website Link; ComponentLink1URL: https://www.we-online.com/redexpert/article/7492540050?ad; ComponentLink2Description: Datasheet Link; ComponentLink2URL: https://www.we-online.com/redexpert/spec/7492540050?ad; Mount: Surface Mount; Operating Temperature Max: 130°C; Operating Temperature Min: -40°C; Packaging: Tape and Reel; Case/Size Code: EE13/7/4; Length: 20.2mm; Width: 14.48mm; Height: 10.5mm; Inductance: 1400uH; Rated Voltage: 80V; Turns Ratio: 1:50
footprint WE-CST_EE13/7/4
simulation model 7492540050
pins: 2, 4, 11, 12

## 7492540060
designator T?, comment 2000uH, 1:60, 80V  (value not drawn)
WE-CST Current Sense Transformer, SMT, EE13/7/4, 2000uH, 1:60, 80V; Manufacturer Part Number: 7492540060; Manufacturer: Wurth Elektronik; DC Resistance 1: 0.28mOhm; DC Resistance 2: 0.305Ohm; Insulation Test Voltage: 1500VAC; Rated Current: 40A; Voltage-µSecond: 148uVs; Category: Current Sense Transformers; Match Code: WE-CST; ComponentLink1Description: Website Link; ComponentLink1URL: https://www.we-online.com/redexpert/article/7492540060?ad; ComponentLink2Description: Datasheet Link; ComponentLink2URL: https://www.we-online.com/redexpert/spec/7492540060?ad; Mount: Surface Mount; Operating Temperature Max: 130°C; Operating Temperature Min: -40°C; Packaging: Tape and Reel; Case/Size Code: EE13/7/4; Length: 20.2mm; Width: 14.48mm; Height: 10.5mm; Inductance: 2000uH; Rated Voltage: 80V; Turns Ratio: 1:60
footprint WE-CST_EE13/7/4
simulation model 7492540060
pins: 2, 4, 11, 12

## 7492540070
designator T?, comment 2740uH, 1:70, 80V  (value not drawn)
WE-CST Current Sense Transformer, SMT, EE13/7/4, 2740uH, 1:70, 80V; Manufacturer Part Number: 7492540070; Manufacturer: Wurth Elektronik; DC Resistance 1: 0.28mOhm; DC Resistance 2: 0.367Ohm; Insulation Test Voltage: 1500VAC; Rated Current: 40A; Voltage-µSecond: 173uVs; Category: Current Sense Transformers; Match Code: WE-CST; ComponentLink1Description: Website Link; ComponentLink1URL: https://www.we-online.com/redexpert/article/7492540070?ad; ComponentLink2Description: Datasheet Link; ComponentLink2URL: https://www.we-online.com/redexpert/spec/7492540070?ad; Mount: Surface Mount; Operating Temperature Max: 130°C; Operating Temperature Min: -40°C; Packaging: Tape and Reel; Case/Size Code: EE13/7/4; Length: 20.2mm; Width: 14.48mm; Height: 10.5mm; Inductance: 2740uH; Rated Voltage: 80V; Turns Ratio: 1:70
footprint WE-CST_EE13/7/4
simulation model 7492540070
pins: 2, 4, 11, 12

## 7492540100
designator T?, comment 5600uH, 1:100, 80V  (value not drawn)
WE-CST Current Sense Transformer, SMT, EE13/7/4, 5600uH, 1:100, 80V; Manufacturer Part Number: 7492540100; Manufacturer: Wurth Elektronik; DC Resistance 1: 0.28mOhm; DC Resistance 2: 0.805Ohm; Insulation Test Voltage: 1500VAC; Rated Current: 40A; Voltage-µSecond: 248uVs; Category: Current Sense Transformers; Match Code: WE-CST; ComponentLink1Description: Website Link; ComponentLink1URL: https://www.we-online.com/redexpert/article/7492540100?ad; ComponentLink2Description: Datasheet Link; ComponentLink2URL: https://www.we-online.com/redexpert/spec/7492540100?ad; Mount: Surface Mount; Operating Temperature Max: 130°C; Operating Temperature Min: -40°C; Packaging: Tape and Reel; Case/Size Code: EE13/7/4; Length: 20.2mm; Width: 14.48mm; Height: 10.5mm; Inductance: 5600uH; Rated Voltage: 80V; Turns Ratio: 1:100
footprint WE-CST_EE13/7/4
simulation model 7492540100
pins: 2, 4, 11, 12

## 7492540150
designator T?, comment 12600uH, 1:150, 80V  (value not drawn)
WE-CST Current Sense Transformer, SMT, EE13/7/4, 12600uH, 1:150, 80V; Manufacturer Part Number: 7492540150; Manufacturer: Wurth Elektronik; DC Resistance 1: 0.28mOhm; DC Resistance 2: 1.9Ohm; Insulation Test Voltage: 1500VAC; Rated Current: 40A; Voltage-µSecond: 372uVs; Category: Current Sense Transformers; Match Code: WE-CST; ComponentLink1Description: Website Link; ComponentLink1URL: https://www.we-online.com/redexpert/article/7492540150?ad; ComponentLink2Description: Datasheet Link; ComponentLink2URL: https://www.we-online.com/redexpert/spec/7492540150?ad; Mount: Surface Mount; Operating Temperature Max: 130°C; Operating Temperature Min: -40°C; Packaging: Tape and Reel; Case/Size Code: EE13/7/4; Length: 20.2mm; Width: 14.48mm; Height: 10.5mm; Inductance: 12600uH; Rated Voltage: 80V; Turns Ratio: 1:150
footprint WE-CST_EE13/7/4
simulation model 7492540150
pins: 2, 4, 11, 12

## 7492540200
designator T?, comment 22400uH, 1:200, 80V  (value not drawn)
WE-CST Current Sense Transformer, SMT, EE13/7/4, 22400uH, 1:200, 80V; Manufacturer Part Number: 7492540200; Manufacturer: Wurth Elektronik; DC Resistance 1: 0.28mOhm; DC Resistance 2: 2.63Ohm; Insulation Test Voltage: 1500VAC; Rated Current: 40A; Voltage-µSecond: 496uVs; Category: Current Sense Transformers; Match Code: WE-CST; ComponentLink1Description: Website Link; ComponentLink1URL: https://www.we-online.com/redexpert/article/7492540200?ad; ComponentLink2Description: Datasheet Link; ComponentLink2URL: https://www.we-online.com/redexpert/spec/7492540200?ad; Mount: Surface Mount; Operating Temperature Max: 130°C; Operating Temperature Min: -40°C; Packaging: Tape and Reel; Case/Size Code: EE13/7/4; Length: 20.2mm; Width: 14.48mm; Height: 10.5mm; Inductance: 22400uH; Rated Voltage: 80V; Turns Ratio: 1:200
footprint WE-CST_EE13/7/4
simulation model 7492540200
pins: 2, 4, 11, 12

## 7492540500
designator T?, comment 135000uH, 1:500, 80V  (value not drawn)
WE-CST Current Sense Transformer, SMT, EE13/7/4, 135000uH, 1:500, 80V; Manufacturer Part Number: 7492540500; Manufacturer: Wurth Elektronik; DC Resistance 1: 0.28mOhm; DC Resistance 2: 21.2Ohm; Insulation Test Voltage: 1500VAC; Rated Current: 40A; Voltage-µSecond: 1240uVs; Category: Current Sense Transformers; Match Code: WE-CST; ComponentLink1Description: Website Link; ComponentLink1URL: https://www.we-online.com/redexpert/article/7492540500?ad; ComponentLink2Description: Datasheet Link; ComponentLink2URL: https://www.we-online.com/redexpert/spec/7492540500?ad; Mount: Surface Mount; Operating Temperature Max: 130°C; Operating Temperature Min: -40°C; Packaging: Tape and Reel; Case/Size Code: EE13/7/4; Length: 20.2mm; Width: 14.48mm; Height: 10.5mm; Inductance: 135000uH; Rated Voltage: 80V; Turns Ratio: 1:500
footprint WE-CST_EE13/7/4
simulation model 7492540500
pins: 2, 4, 11, 12

## 7492540750
designator T?, comment 300000uH, 1:750, 80V  (value not drawn)
WE-CST Current Sense Transformer, SMT, EE13/7/4, 300000uH, 1:750, 80V; Manufacturer Part Number: 7492540750; Manufacturer: Wurth Elektronik; DC Resistance 1: 0.28mOhm; DC Resistance 2: 50.1Ohm; Insulation Test Voltage: 1500VAC; Rated Current: 40A; Voltage-µSecond: 1860uVs; Category: Current Sense Transformers; Match Code: WE-CST; ComponentLink1Description: Website Link; ComponentLink1URL: https://www.we-online.com/redexpert/article/7492540750?ad; ComponentLink2Description: Datasheet Link; ComponentLink2URL: https://www.we-online.com/redexpert/spec/7492540750?ad; Mount: Surface Mount; Operating Temperature Max: 130°C; Operating Temperature Min: -40°C; Packaging: Tape and Reel; Case/Size Code: EE13/7/4; Length: 20.2mm; Width: 14.48mm; Height: 10.5mm; Inductance: 300000uH; Rated Voltage: 80V; Turns Ratio: 1:750
footprint WE-CST_EE13/7/4
simulation model 7492540750
pins: 2, 4, 11, 12

## 7492541000
designator T?, comment 540000uH, 1:1000, 80V  (value not drawn)
WE-CST Current Sense Transformer, SMT, EE13/7/4, 540000uH, 1:1000, 80V; Manufacturer Part Number: 7492541000; Manufacturer: Wurth Elektronik; DC Resistance 1: 0.28mOhm; DC Resistance 2: 87.64Ohm; Insulation Test Voltage: 1500VAC; Rated Current: 40A; Voltage-µSecond: 2480uVs; Category: Current Sense Transformers; Match Code: WE-CST; ComponentLink1Description: Website Link; ComponentLink1URL: https://www.we-online.com/redexpert/article/7492541000?ad; ComponentLink2Description: Datasheet Link; ComponentLink2URL: https://www.we-online.com/redexpert/spec/7492541000?ad; Mount: Surface Mount; Operating Temperature Max: 130°C; Operating Temperature Min: -40°C; Packaging: Tape and Reel; Case/Size Code: EE13/7/4; Length: 20.2mm; Width: 14.48mm; Height: 10.5mm; Inductance: 540000uH; Rated Voltage: 80V; Turns Ratio: 1:1000
footprint WE-CST_EE13/7/4
simulation model 7492541000
pins: 2, 4, 11, 12